# Altium footprint library XU-GENARAL PCB .PcbLib: 1176 footprints (part 56 of 75)
Each footprint in its own frame and in the unit in brackets; x right, y up, seen from the top. Pads: shape width x height; smd on the part's side, far side on the other; paste and mask are expansions set on the pad; w line width, h text height; cw(c..) or ccw(c..) is an arc to the next point about the centre after c.
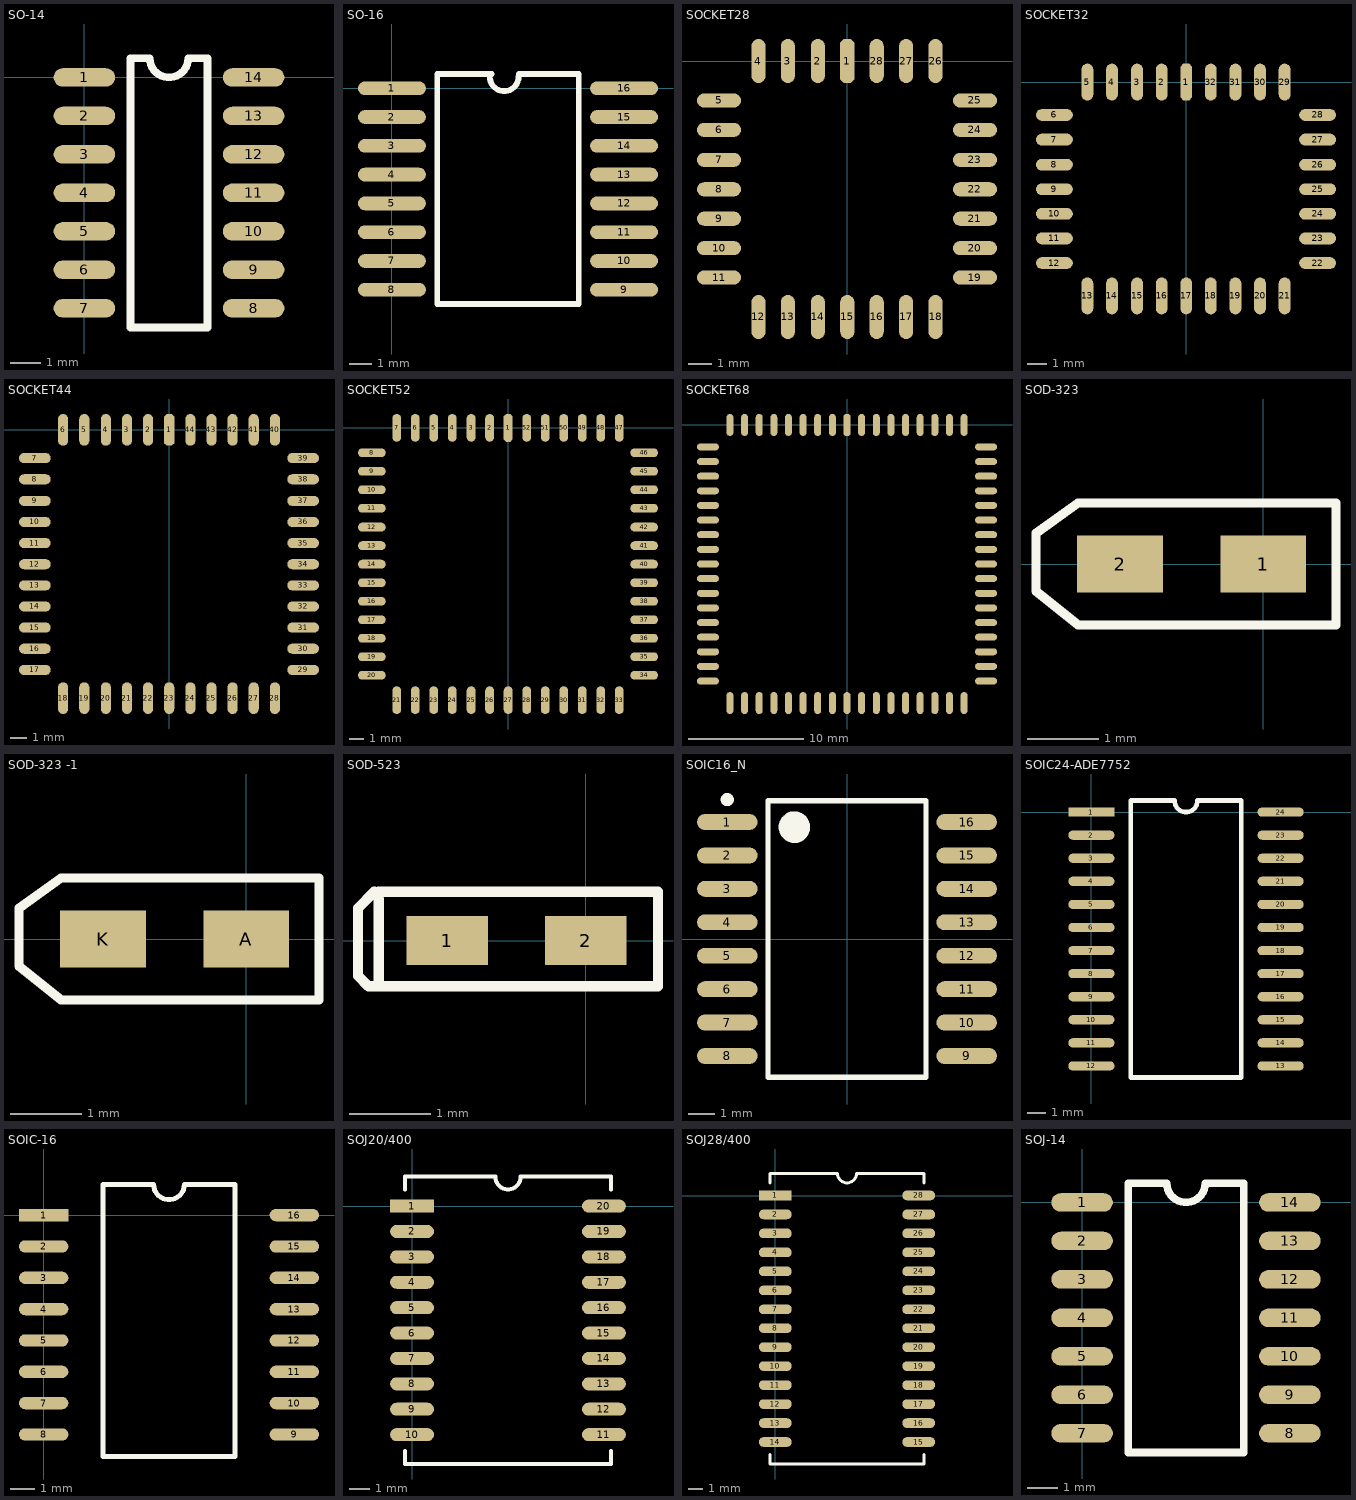
[diagram p55: the footprints below, top view; thin cyan lines are the x and y axes]

## SO-14 [mil]
pads (14):
  oval 80x24 smd: 1(0,0) 2(0,-50) 3(0,-100) 4(0,-150) 5(0,-200) 6(0,-250) 7(0,-300) 8(220,-300) 9(220,-250) 10(220,-200) 11(220,-150) 12(220,-100) 13(220,-50) 14(220,0)
Top Overlay:
  lines w10: 60,-325 60,25 85,25 ccw(c110,25) 135,25 160,25 160,-325 60,-325

## SO-16 [mm]
pads (16):
  oval 3x0.61 smd: 1(0,0) 2(0,-1.27) 3(0,-2.54) 4(0,-3.81) 5(0,-5.08) 6(0,-6.35) 7(0,-7.62) 8(0,-8.89) 9(10.24,-8.89) 10(10.24,-7.62) 11(10.24,-6.35) 12(10.24,-5.08) 13(10.24,-3.81) 14(10.24,-2.54) 15(10.24,-1.27) 16(10.24,0)
Top Overlay:
  lines w0.254: 4.318,0.508 ccw(c4.953,0.508) 5.588,0.508 ; 4.4,0.635 2,0.635 2,-9.525 8.24,-9.525 8.24,0.635 5.6,0.635

## SOCKET28 [mil]
pads (28):
  oct 24x75 smd: 1(0,0)
  oval 24x75 smd: 2(-50,0) 3(-101,0) 4(-151,0) 12(-151,-435) 13(-101,-435) 14(-50,-435) 15(0,-435) 16(50,-435) 17(100,-435) 18(150,-435) 26(150,0) 27(100,0) 28(50,0)
  oval 75x24 smd: 5(-218,-67) 6(-218,-117) 7(-218,-168) 8(-218,-218) 9(-218,-268) 10(-218,-318) 11(-218,-368) 19(217,-368) 20(217,-318) 21(217,-268) 22(217,-218) 23(217,-168) 24(217,-117) 25(217,-67)

## SOCKET32 [mil]
pads (32):
  oct 24x75 smd: 1(0,0)
  oval 24x75 smd: 2(-50,0) 3(-100,0) 4(-151,0) 5(-201,0) 13(-201,-435) 14(-151,-435) 15(-100,-435) 16(-50,-435) 17(0,-435) 18(50,-435) 19(100,-435) 20(150,-435) 21(200,-435) 29(200,0) 30(150,0) 31(100,0) 32(50,0)
  oval 75x24 smd: 6(-268,-67) 7(-268,-117) 8(-268,-168) 9(-268,-218) 10(-268,-268) 11(-268,-318) 12(-268,-368) 22(267,-368) 23(267,-318) 24(267,-268) 25(267,-218) 26(267,-168) 27(267,-117) 28(267,-67)

## SOCKET44 [mil]
pads (44):
  oct 24x75 smd: 1(0,0)
  oval 24x75 smd: 2(-50,0) 3(-100,0) 4(-150,0) 5(-201,0) 6(-251,0) 18(-251,-635) 19(-201,-635) 20(-150,-635) 21(-100,-635) 22(-50,-635) 23(0,-635) 24(50,-635) 25(100,-635) 26(150,-635) 27(200,-635) 28(250,-635) 40(250,0) 41(200,0) 42(150,0) 43(100,0) 44(50,0)
  oval 75x24 smd: 7(-318,-67) 8(-318,-117) 9(-318,-168) 10(-318,-218) 11(-318,-268) 12(-318,-318) 13(-318,-368) 14(-318,-418) 15(-318,-468) 16(-318,-518) 17(-318,-568) 29(317,-568) 30(317,-518) 31(317,-468) 32(317,-418) 33(317,-368) 34(317,-318) 35(317,-268) 36(317,-218) 37(317,-168) 38(317,-117) 39(317,-67)

## SOCKET52 [mil]
pads (52):
  oct 24x75 smd: 1(0,0)
  oval 24x75 smd: 2(-50,0) 3(-100,0) 4(-151,0) 5(-201,0) 6(-251,0) 7(-301,0) 21(-301,-735) 22(-251,-735) 23(-201,-735) 24(-151,-735) 25(-100,-735) 26(-50,-735) 27(0,-735) 28(50,-735) 29(100,-735) 30(150,-735) 31(200,-735) 32(250,-735) 33(300,-735) 47(300,0) 48(250,0) 49(200,0) 50(150,0) 51(100,0) 52(50,0)
  oval 75x24 smd: 8(-368,-67) 9(-368,-117) 10(-368,-167) 11(-368,-217) 12(-368,-268) 13(-368,-318) 14(-368,-368) 15(-368,-418) 16(-368,-468) 17(-368,-518) 18(-368,-568) 19(-368,-618) 20(-368,-668) 34(367,-668) 35(367,-618) 36(367,-568) 37(367,-518) 38(367,-468) 39(367,-418) 40(367,-368) 41(367,-318) 42(367,-268) 43(367,-217) 44(367,-167) 45(367,-117) 46(367,-67)

## SOCKET68 [mil]
pads (68):
  oct 24x75 smd: 1(0,0)
  oval 24x75 smd: 2(-50,0) 3(-100,0) 4(-150,0) 5(-200,0) 6(-250,0) 7(-300,0) 8(-350,0) 9(-400,0) 27(-400,-950) 28(-350,-950) 29(-300,-950) 30(-250,-950) 31(-200,-950) 32(-150,-950) 33(-100,-950) 34(-50,-950) 35(0,-950) 36(50,-950) 37(100,-950) 38(150,-950) 39(200,-950) 40(250,-950) 41(300,-950) 42(350,-950) 43(400,-950) 61(400,0) 62(350,0) 63(300,0) 64(250,0) 65(200,0) 66(150,0) 67(100,0) 68(50,0)
  oval 75x24 smd: 10(-475,-75) 11(-475,-125) 12(-475,-175) 13(-475,-225) 14(-475,-275) 15(-475,-325) 16(-475,-375) 17(-475,-425) 18(-475,-475) 19(-475,-525) 20(-475,-575) 21(-475,-625) 22(-475,-675) 23(-475,-725) 24(-475,-775) 25(-475,-825) 26(-475,-875) 44(475,-875) 45(475,-825) 46(475,-775) 47(475,-725) 48(475,-675) 49(475,-625) 50(475,-575) 51(475,-525) 52(475,-475) 53(475,-425) 54(475,-375) 55(475,-325) 56(475,-275) 57(475,-225) 58(475,-175) 59(475,-125) 60(475,-75)

## SOD-323 [mm]
pads (2):
  rect 1.2x0.8 smd: 1(0,0) 2(-2,0)
Top Overlay:
  lines w0.127: -3.175,-0.381 -3.175,0.432 -2.591,0.85 1.016,0.85 1.016,-0.85 -2.591,-0.85 -3.175,-0.381

## SOD-323 -1 [mm]
pads (2):
  rect 1.2x0.8 smd: A(0,0) K(-2,0)
Top Overlay:
  lines w0.127: -3.175,-0.381 -2.591,-0.85 1.016,-0.85 1.016,0.85 -2.591,0.85 -3.175,0.432 -3.175,-0.381

## SOD-523 [mm]
pads (2):
  rect 1x0.6 smd: 1(-1.7,0) 2(0,0)
Top Overlay:
  lines w0.127: -2.594,0.6 -2.794,0.4 -2.794,-0.432 -2.666,-0.56 -2.54,-0.56 0.889,-0.56 0.889,0.6 -2.54,0.6 ; -2.54,-0.508 -2.54,0.508

## SOIC16_N [mm] "SOIC, 16-Leads, Body 10.3x7.5mm, Pitch 1.27mm, IPC Medium Density"
height 2.65
pads (16):
  oval 2.3x0.6 smd: 1(-4.55,4.445) 2(-4.55,3.175) 3(-4.55,1.905) 4(-4.55,0.635) 5(-4.55,-0.635) 6(-4.55,-1.905) 7(-4.55,-3.175) 8(-4.55,-4.445) 9(4.55,-4.445) 10(4.55,-3.175) 11(4.55,-1.905) 12(4.55,-0.635) 13(4.55,0.635) 14(4.55,1.905) 15(4.55,3.175) 16(4.55,4.445)
Top Overlay:
  circle w0.25: c-4.55,5.295 r0.125
  circle w0.6: c-2,4.25 r0.3
  lines w0.2: -3,-5.25 -3,5.25 3,5.25 3,-5.25 -3,-5.25

## SOIC24-ADE7752 [mil]
pads (24):
  rect 100x20 smd: 1(0,0)
  oval 100x20 smd: 2(0,-50) 3(0,-100) 4(0,-150) 5(0,-200) 6(0,-250) 7(0,-300) 8(0,-350) 9(0,-400) 10(0,-450) 11(0,-500) 12(0,-550) 13(410,-550) 14(410,-500) 15(410,-450) 16(410,-400) 17(410,-350) 18(410,-300) 19(410,-250) 20(410,-200) 21(410,-150) 22(410,-100) 23(410,-50) 24(410,0)
Top Overlay:
  lines w10: 85,-575 85,25 180,25 ccw(c205,25) 230,25 325,25 325,-575 85,-575

## SOIC-16 [mm]
pads (16):
  rect 2x0.5 smd: 1(0,0)
  oval 2x0.5 smd: 2(0,-1.27) 3(0,-2.54) 4(0,-3.81) 5(0,-5.08) 6(0,-6.35) 7(0,-7.62) 8(0,-8.89) 9(10.16,-8.89) 10(10.16,-7.62) 11(10.16,-6.35) 12(10.16,-5.08) 13(10.16,-3.81) 14(10.16,-2.54) 15(10.16,-1.27) 16(10.16,0)
Top Overlay:
  lines w0.2: 2.413,-9.779 7.747,-9.779 7.747,1.25 5.705,1.25 cw(c5.08,1.25) 4.455,1.25 2.413,1.25 2.413,-9.779

## SOJ20/400 [mm]
height 6.8
pads (20):
  rect 2.2x0.65 smd: 1(0,0)
  oval 2.2x0.65 smd: 2(0,-1.27) 3(0,-2.54) 4(0,-3.81) 5(0,-5.08) 6(0,-6.35) 7(0,-7.62) 8(0,-8.89) 9(0,-10.16) 10(0,-11.43) 11(9.6,-11.43) 12(9.6,-10.16) 13(9.6,-8.89) 14(9.6,-7.62) 15(9.6,-6.35) 16(9.6,-5.08) 17(9.6,-3.81) 18(9.6,-2.54) 19(9.6,-1.27) 20(9.6,0)
Top Overlay:
  lines w0.2: -0.345,-12.255 -0.345,-12.9 9.945,-12.9 9.945,-12.255 ; -0.345,0.825 -0.345,1.47 4.165,1.47 ccw(c4.8,1.47) 5.435,1.47 9.945,1.47 9.945,0.825

## SOJ28/400 [mm]
pads (28):
  rect 2.2x0.65 smd: 1(0.008,0.012)
  oval 2.2x0.65 smd: 2(0.008,-1.258) 3(0.008,-2.528) 4(0.008,-3.798) 5(0.008,-5.068) 6(0.008,-6.338) 7(0.008,-7.608) 8(0.008,-8.878) 9(0.008,-10.148) 10(0.008,-11.418) 11(0.008,-12.688) 12(0.008,-13.958) 13(0.008,-15.228) 14(0.008,-16.498) 15(9.608,-16.498) 16(9.608,-15.228) 17(9.608,-13.958) 18(9.608,-12.688) 19(9.608,-11.418) 20(9.608,-10.148) 21(9.608,-8.878) 22(9.608,-7.608) 23(9.608,-6.338) 24(9.608,-5.068) 25(9.608,-3.798) 26(9.608,-2.528) 27(9.608,-1.258) 28(9.608,0.012)
Top Overlay:
  lines w0.2: -0.337,-17.323 -0.337,-17.968 9.953,-17.968 9.953,-17.323 ; -0.337,0.837 -0.337,1.482 4.173,1.482 ccw(c4.808,1.482) 5.443,1.482 9.953,1.482 9.953,0.837

## SOJ-14 [mil]
pads (14):
  oval 80x24 smd: 1(0,0) 2(0,-50) 3(0,-100) 4(0,-150) 5(0,-200) 6(0,-250) 7(0,-300) 8(270,-300) 9(270,-250) 10(270,-200) 11(270,-150) 12(270,-100) 13(270,-50) 14(270,0)
Top Overlay:
  lines w10: 60,-325 60,25 110,25 ccw(c135,25) 160,25 210,25 210,-325 60,-325